# Altium footprint library Footprints.PcbLib: 158 footprints (part 7 of 10)
Each footprint in its own frame and in the unit in brackets; x right, y up, seen from the top. Pads: shape width x height; smd on the part's side, far side on the other; paste and mask are expansions set on the pad; w line width, h text height; cw(c..) or ccw(c..) is an arc to the next point about the centre after c.
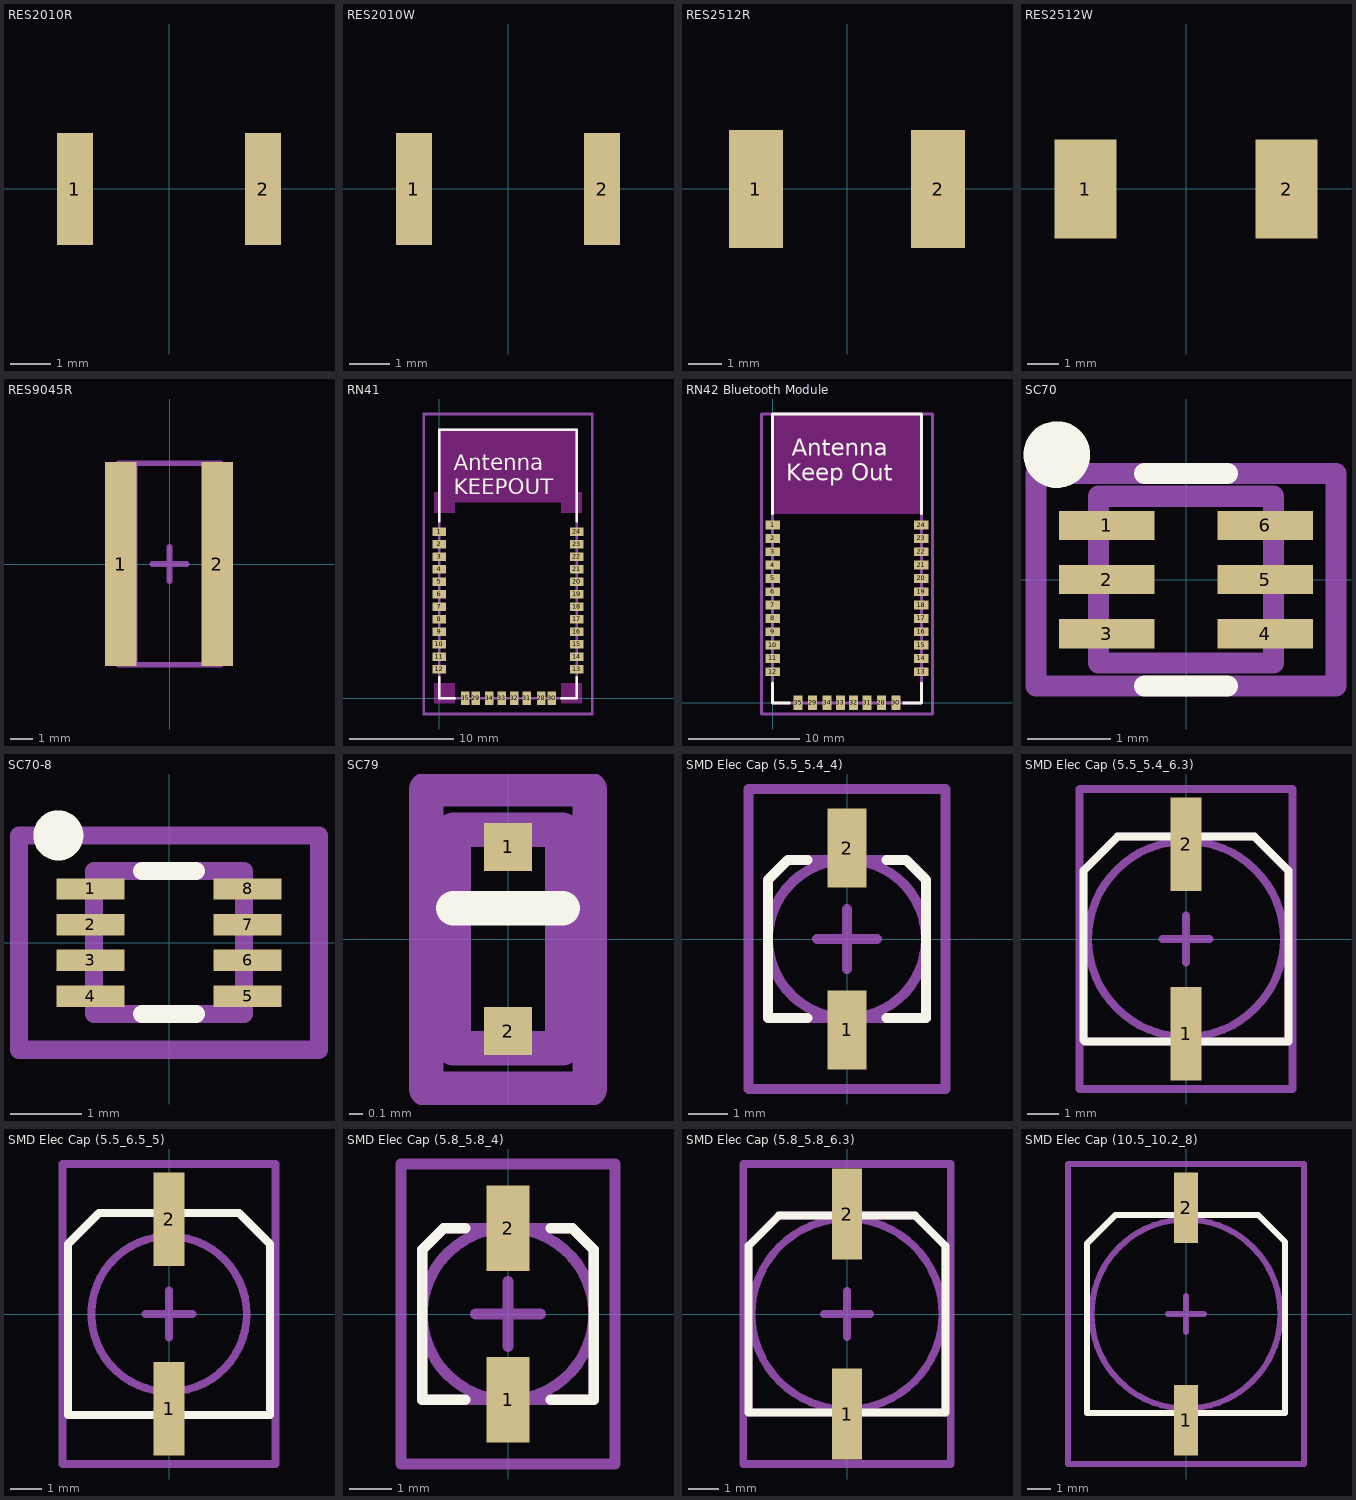
[diagram p6: the footprints below, top view; thin cyan lines are the x and y axes]

## RES2010R [mm] "resistor 2010 reflow soldering"
pads (2):
  rect 0.9x2.8 smd: 1(-2.35,0) 2(2.35,0)
3D body: height 0.55, standoff 0, extent -2.45,-1.2 2.45,1.2

## RES2010W [mm] "resistor 2010 wave soldering"
pads (2):
  rect 0.9x2.8 smd: 1(-2.35,0) 2(2.35,0)
3D body: height 0.55, standoff 0, extent -2.45,-1.2 2.45,1.2

## RES2512R [mm] "resistor 2512 reflow soldering"
pads (2):
  rect 1.6x3.5 smd: 1(-2.7,0) 2(2.7,0)
3D body: height 0.55, standoff 0, extent -3.15,-1.55 3.15,1.55

## RES2512W [mm] "resistor 2512 wave soldering"
pads (2):
  rect 2x3.2 smd: 1(-3.25,0) 2(3.25,0)
3D body: height 0.55, standoff 0, extent -3.15,-1.55 3.15,1.55

## RES9045R [mm] "Resistor 4W Metal Foil Current Sense FCSL series OHMITE"
height 0.5
pads (2):
  rect 1.4x9 smd: 1(-2.15,0) 2(2.1,0)
Mechanical 15:
  lines w0.254: -1.55,-4.45 -1.55,4.45 ; -0.762,0 0.762,0 ; 0,-0.762 0,0.762 ; 1.55,-4.45 1.55,4.45 ; -2.25,-4.45 2.25,-4.45 2.25,4.45 -2.25,4.45 -2.25,-4.45
3D body: height 0.5, standoff 0.25, extent -2.25,-4.45 2.25,4.45
3D body: height 0.25, standoff 0, extent 1.55,-4.45 2.25,4.45
3D body: height 0.25, standoff 0, extent -2.25,-4.45 -1.55,4.45

## RN41 [mm] "2.4GHz Class 1 Bluetooth Module"
height 2
pads (32):
  rect 1.3x0.8 smd: 1(0,16) 2(0,14.8) 3(0,13.6) 4(0,12.4) 5(0,11.2) 6(0,10) 7(0,8.8) 8(0,7.6) 9(0,6.4) 10(0,5.2) 11(0,4) 12(0,2.8) 13(13.2,2.8) 14(13.2,4) 15(13.2,5.2) 16(13.2,6.4) 17(13.2,7.6) 18(13.2,8.8) 19(13.2,10) 20(13.2,11.2) 21(13.2,12.4) 22(13.2,13.6) 23(13.2,14.8) 24(13.2,16)
  rect 0.8x1.3 smd: 28(9.8,0) 29(3.5,0) 30(10.8,0) 31(8.4,0) 32(7.2,0) 33(6,0) 34(4.8,0) 35(2.5,0)
Top Layer keep-out:
  rectangle: -0.5,-0.5 1.5,1.5
  rectangle: 11.7,-0.5 13.7,1.5
  rectangle: 0,18.8 13.2,25.8
  rectangle: 11.7,17.8 13.7,19.8
  rectangle: -0.5,17.8 1.5,19.8
Top Overlay:
  lines w0.254: 0,2 0,0 1.5,0 ; 0,17 0,25.8 13.2,25.8 13.2,17 ; 11.7,0 13.2,0 13.2,2
  text "Antenna / KEEPOUT" at 1.4,19.6 h1.52
Mechanical 13:
  lines w0.254: 0,2 0,0 ; 0,0 13.2,0 13.2,25.8 0,25.8 0,0
Mechanical 15:
  lines w0.254: -1.5,-1.5 14.7,-1.5 14.7,27.3 -1.5,27.3 -1.5,-1.5
3D body: height 3.5, standoff 1.5, extent 2,22.3 11.2,25.3
3D body: height 1.5, standoff 0, extent 0,0 13.2,25.8
3D body: height 4, standoff 1.5, extent 0.3,0.3 12.9,17.7

## RN42 Bluetooth Module [mm]
pads (32):
  rect 1.3x0.8 smd: 1(0,16) 2(0,14.8) 3(0,13.6) 4(0,12.4) 5(0,11.2) 6(0,10) 7(0,8.8) 8(0,7.6) 9(0,6.4) 10(0,5.2) 11(0,4) 12(0,2.8) 13(13.4,2.8) 14(13.4,4) 15(13.4,5.2) 16(13.4,6.4) 17(13.4,7.6) 18(13.4,8.8) 19(13.4,10) 20(13.4,11.2) 21(13.4,12.4) 22(13.4,13.6) 23(13.4,14.8) 24(13.4,16)
  rect 0.8x1.3 smd: 28(9.8,0) 29(3.6,0) 30(11.1,0) 31(8.5,0) 32(7.3,0) 33(6.1,0) 34(4.9,0) 35(2.3,0)
Top Layer keep-out:
  region: 13.4,26 13.4,17.018 0,17.018 0,26
Top Overlay:
  lines w0.254: 0,1.778 0,0 1.524,0 ; 0,17.018 0,26 13.4,26 13.4,17.018 ; 0,19 0,20.25 ; 0,21.5 0,22.75 ; 0,23.25 0,24.5 ; 2.75,26 4,26 ; 5.25,26 6.5,26 ; 7.75,26 8.982,26 ; 10.25,26 11.25,26 11.5,26 ; 11.811,0 13.4,0 13.4,1.778
  text "Keep Out" at 1.25,20 h1.5
  text "Antenna" at 1.75,22.25 h1.5
Mechanical 13:
  lines w0.254: 0,0 13.4,0 13.4,26 0,26 0,0
Mechanical 15:
  lines w0.254: -1,-1 14.4,-1 14.4,26 -1,26 -1,-1
3D body: height 4, standoff 1, extent 1.25,1.25 12,18.75
3D body: height 1, standoff 0, extent 0,0 13.4,26

## SC70 [mm]
height 1.1
pads (6):
  rect 1.15x0.35 smd: 1(-0.95,0.65) 2(-0.95,0) 3(-0.95,-0.65) 4(0.95,-0.65) 5(0.95,0) 6(0.95,0.65)
Top Overlay:
  circle w0.5: c-1.55,1.5 r0.15
  lines w0.254: -0.5,-1.275 0.5,-1.275 ; -0.5,1.275 0.5,1.275
Mechanical 13:
  lines w0.254: -1.05,-1 1.05,-1 1.05,1 -1.05,1 -1.05,-1
Mechanical 15:
  lines w0.254: -1.8,-1.275 1.8,-1.275 1.8,1.275 -1.8,1.275 -1.8,-1.275
3D body: height 0.92, standoff -0.03, extent -1.05,-1 1.05,1

## SC70-8 [mm]
height 1.1
pads (8):
  rect 0.95x0.3 smd: 1(-1.1,0.75) 2(-1.1,0.25) 3(-1.1,-0.25) 4(-1.1,-0.75) 5(1.1,-0.75) 6(1.1,-0.25) 7(1.1,0.25) 8(1.1,0.75)
Top Overlay:
  circle w0.5: c-1.55,1.5 r0.1
  lines w0.254: -0.375,-1 0.375,-1 ; -0.375,1 0.375,1
Mechanical 13:
  lines w0.254: -1.05,-1 -1.05,1 1.05,1 1.05,-1 -1.05,-1
Mechanical 15:
  lines w0.254: -2.1,-1.5 -2.1,1.5 2.1,1.5 2.1,-1.5 -2.1,-1.5
3D body: height 0.9, standoff -0.02, extent -1.05,-1 1.05,1

## SC79 [mm]
height 0.55
pads (2):
  rect 0.35x0.35 smd mask+0.102: 1(0,0.675) 2(0,-0.675)
Top Overlay:
  lines w0.254: -0.4,0.225 0.4,0.225
Mechanical 13:
  lines w0.254: -0.4,-0.8 -0.4,0.8 0.4,0.8 0.4,-0.8 -0.4,-0.8
Mechanical 15:
  lines w0.254: -0.6,-1.1 -0.6,1.1 0.6,1.1 0.6,-1.1 -0.6,-1.1
3D body: height 0.15, standoff 0, extent -0.175,-0.725 0.175,-0.575
3D body: height 0.15, standoff 0, extent -0.175,0.575 0.175,0.725
3D body: height 0.55, standoff 0, extent -0.4,-0.575 0.4,0.575
3D body: height 0.56, standoff 0.1, extent -0.4,0.263 0.4,0.338

## SMD Elec Cap (5.5_5.4_4) [mm] "L=5.5mm, H=5.4mm, D=4mm"
height 5.5
pads (2):
  rect 1x2 smd mask+0.102: 1(0,-2.3) 2(0,2.3)
Top Overlay:
  lines w0.254: -1,-2 -2,-2 -2,1 -2,1.5 -1.5,2 -1,2 ; 1,-2 2,-2 2,1 2,1.5 1.5,2 1,2
Mechanical 13:
  circle w0.254: c0,0 r2
  lines w0.254: -2,-2 2,-2 2,1.5 1.5,2 -1.5,2 -2,1.5 -2,-2
Mechanical 15:
  lines w0.254: -0.762,0 0.762,0 ; 0,-0.762 0,0.762 ; -2.5,-3.8 -2.5,3.8 2.5,3.8 2.5,-3.8 -2.5,-3.8
3D body: height 5.51, standoff 5.4, extent -1.5,-1.25 1.5,-0.75
3D body: height 5.5, standoff 0.5, extent -1.984,-1.996 2,1.996
3D body: height 1, standoff 0, extent -2,-2 2,2

## SMD Elec Cap (5.5_5.4_6.3) [mm] "L=5.5mm, H=5.4mm, D=6.3mm"
height 5.8
pads (2):
  rect 1x3 smd mask+0.102: 1(0,-3.048) 2(0,3.048)
Top Overlay:
  lines w0.254: -3.3,-3.25 -3.25,-3.3 3.3,-3.3 3.3,2.2 2.2,3.3 -2.2,3.3 -3.3,2.2 -3.3,-3.25
Mechanical 13:
  circle w0.254: c0,0 r3.15
  lines w0.254: -3.3,-3.3 -3.3,2.2 -2.2,3.3 2.2,3.3 3.3,2.2 3.3,-3.3 -3.3,-3.3
Mechanical 15:
  lines w0.254: -0.762,0 0.762,0 ; 0,-0.762 0,0.762 ; -3.429,-4.826 3.429,-4.826 3.429,4.826 -3.429,4.826 -3.429,-4.826
3D body: height 2, standoff 0, extent -3.302,-3.302 3.302,3.302
3D body: height 5.8, standoff 0, extent -3.125,-3.144 3.15,3.144

## SMD Elec Cap (5.5_6.5_5) [mm] "L=5.5mm, H=6.5mm, D=5mm"
height 5.8
pads (2):
  rect 1x3 smd mask+0.102: 1(0,-3.048) 2(0,3.048)
Top Overlay:
  lines w0.254: -3.25,-3.25 3.25,-3.25 3.25,2.25 2.25,3.25 -2.25,3.25 -3.25,2.25 -3.25,-3.25
Mechanical 13:
  circle w0.254: c0,0 r2.5
  lines w0.254: 2.211,3.25 -2.25,3.25 -3.25,2.25 -3.25,-3.25 3.25,-3.25 3.25,2.211 ; 2.25,3.25 3.25,2.25
Mechanical 15:
  lines w0.254: -0.762,0 0.762,0 ; 0,-0.762 0,0.762 ; -3.429,-4.826 -3.429,4.826 3.429,4.826 3.429,-4.826 -3.429,-4.826
3D body: height 5.8, standoff 0, extent -2.48,-2.495 2.5,2.495
3D body: height 2, standoff 0, extent -3.302,-3.302 3.302,3.302

## SMD Elec Cap (5.8_5.8_4) [mm] "L=5.8mm, H=5.8mm, D=4mm"
height 5.8
pads (2):
  rect 1x2 smd mask+0.102: 1(0,-2) 2(0,2)
Top Overlay:
  lines w0.254: -1,-2 -2,-2 -2,1 -2,1.5 -1.5,2 -1,2 ; 1,-2 2,-2 2,1 2,1.5 1.5,2 1,2
Mechanical 13:
  circle w0.254: c0,0 r2
  lines w0.254: -2,-2 -2,1.5 -1.5,2 1.5,2 2,1.5 2,-2 -2,-2
Mechanical 15:
  lines w0.254: -0.762,0 0.762,0 ; 0,-0.762 0,0.762 ; -2.5,-3.5 2.5,-3.5 2.5,3.5 -2.5,3.5 -2.5,-3.5
3D body: height 1, standoff 0, extent -2,-2 2,2
3D body: height 5.5, standoff 0.5, extent -1.984,-1.996 2,1.996
3D body: height 5.51, standoff 5.4, extent -1.5,-1.25 1.5,-0.75

## SMD Elec Cap (5.8_5.8_6.3) [mm] "L=5.8mm, H=5.8mm, D=6.3mm"
height 5.8
pads (2):
  rect 1x3 smd mask+0.102: 1(0,-3.302) 2(0,3.302)
Top Overlay:
  lines w0.254: -3.25,-3.25 -3.25,2.25 -2.25,3.25 2.25,3.25 3.25,2.25 3.25,-3.25 -3.25,-3.25
Mechanical 13:
  circle w0.254: c0,0 r3.15
  lines w0.254: 2.211,3.25 -2.25,3.25 -3.25,2.25 -3.25,-3.25 3.25,-3.25 3.25,2.211 ; 2.25,3.25 3.25,2.25
Mechanical 15:
  lines w0.254: -0.762,0 0.762,0 ; 0,-0.762 0,0.762 ; -3.429,-4.953 3.429,-4.953 3.429,4.953 -3.429,4.953 -3.429,-4.953
3D body: height 2, standoff 0, extent -3.302,-3.302 3.302,3.302
3D body: height 5.8, standoff 0, extent -3.125,-3.144 3.15,3.144

## SMD Elec Cap (10.5_10.2_8) [mm] "L=10.5mm, H=10.2mm, D=8mm"
height 8
pads (2):
  rect 1x3 smd mask+0.102: 1(0,-4.5) 2(0,4.5)
Top Overlay:
  lines w0.254: -4.2,-4.2 -4.2,2.975 -2.975,4.2 3.05,4.2 4.2,3.05 4.2,-4.2 -4.2,-4.2
Mechanical 13:
  circle w0.254: c0,0 r4
  lines w0.254: -4.2,-4.2 -4.2,2.975 -2.975,4.2 3.05,4.2 4.2,3.05 4.2,-4.2 -4.2,-4.2
Mechanical 15:
  lines w0.254: -0.762,0 0.762,0 ; 0,-0.762 0,0.762 ; -5,-6.35 5,-6.35 5,6.35 -5,6.35 -5,-6.35
3D body: height 8, standoff 0, extent -3.968,-3.992 4,3.992
3D body: height 1.5, standoff 0, extent -4.2,-4.2 4.2,4.2